# Altium footprint library pcb_ConnectorGeneral.PcbLib: 111 footprints (part 2 of 7)
Each footprint in its own frame and in the unit in brackets; x right, y up, seen from the top. Pads: shape width x height; smd on the part's side, far side on the other; paste and mask are expansions set on the pad; w line width, h text height; cw(c..) or ccw(c..) is an arc to the next point about the centre after c.
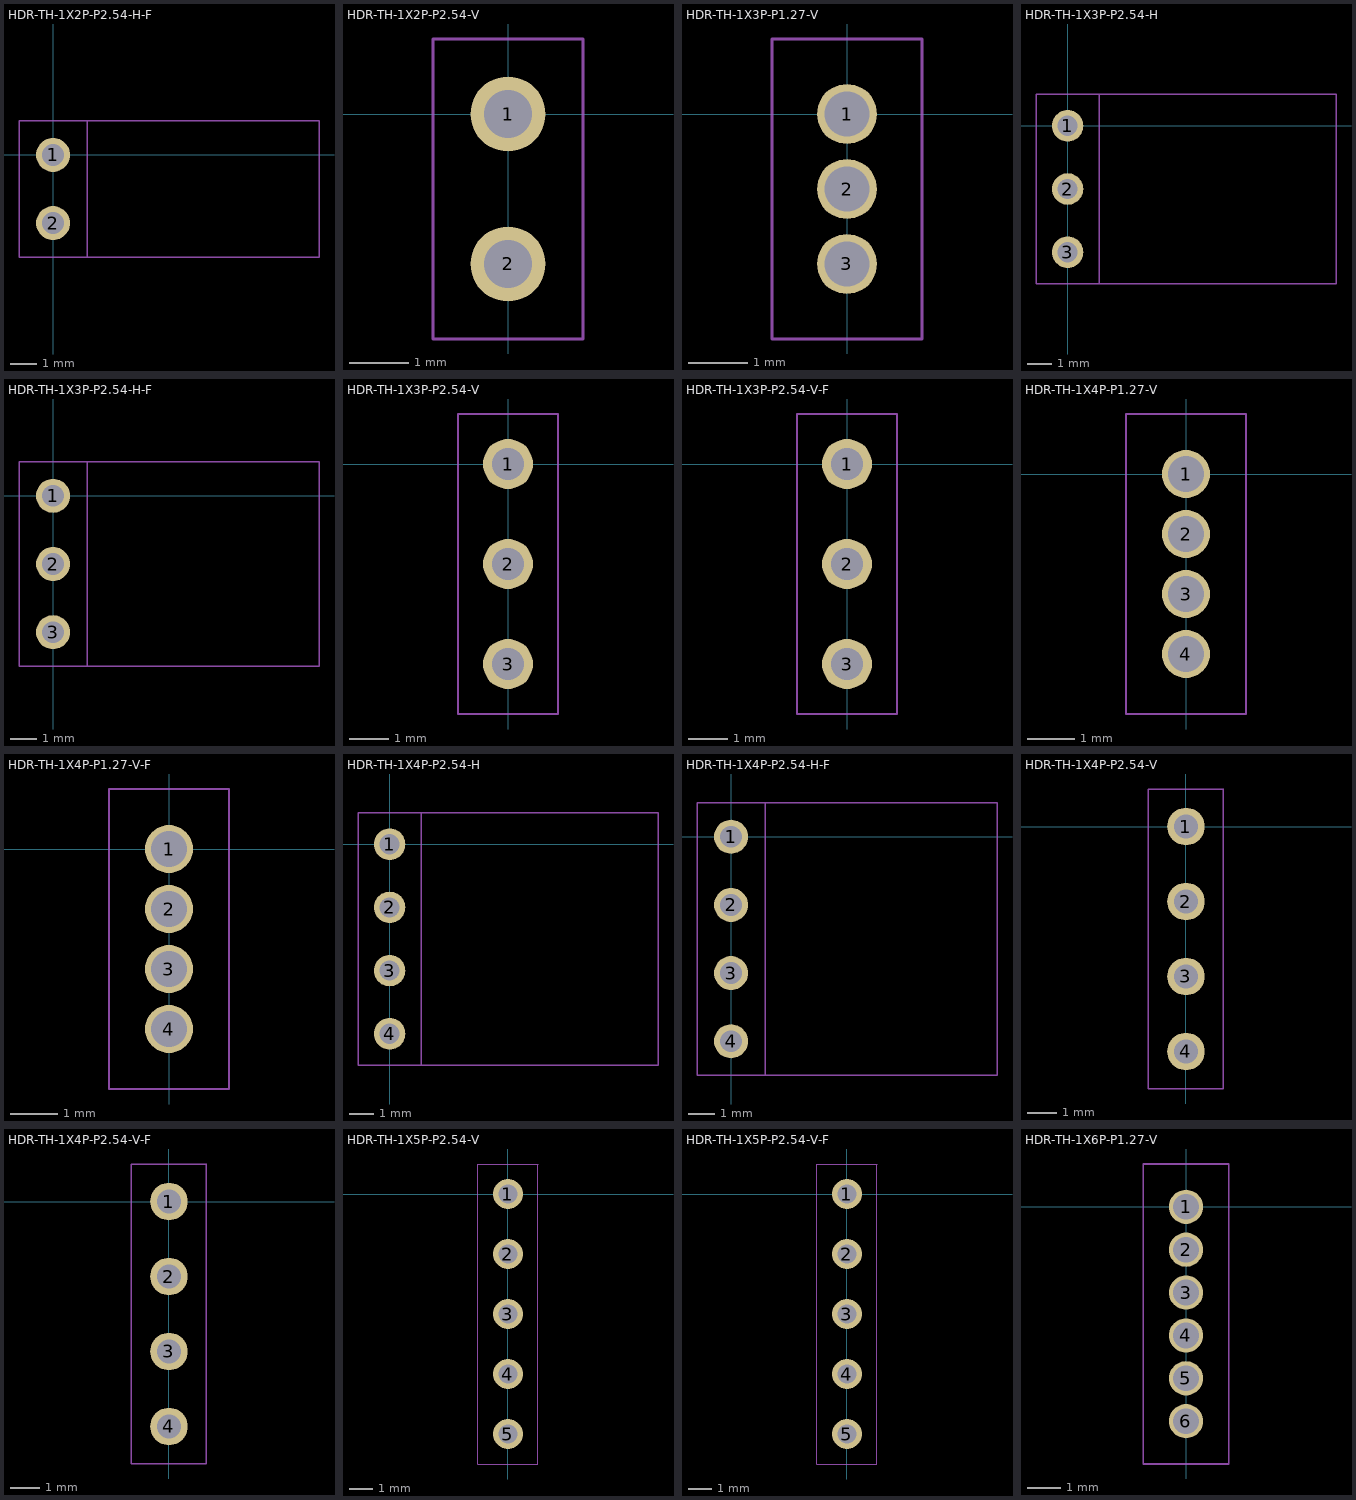
[diagram p1: the footprints below, top view; thin cyan lines are the x and y axes]

## HDR-TH-1X2P-P2.54-H-F [mil]
height 169.29
pads (2):
  round 50 hole 32: 1(0,0) 2(0,-100)
Mechanical 13:
  lines w2: -50,-150 390,-150 390,50 -50,50 -50,-150
Mechanical 14:
  lines w2: -50,-150 50,-150 50,50 -50,50 -50,-150
Mechanical 16:
  text ".Designator" at 0,0 h39.37
3D body "female_header_a-bl254-ea-g02d.stp": height 99.21, standoff -125.2, extent -10,-154.92 386.06,54.92

## HDR-TH-1X2P-P2.54-V [mil]
height 169.29
pads (2):
  round 50 hole 32: 1(0,0) 2(0,-100)
Mechanical 13:
  lines w2: -50,-150 -50,50 50,50 50,-150 -50,-150
Mechanical 14:
  lines w2: -50,-150 -50,50 50,50 50,-150 -50,-150
Mechanical 16:
  text ".Designator" at 0,0 h39.37
3D body "pin_header_aw140-eg-g02d.stp": height 322.83, standoff -118.11, extent -49.18,-150 49.18,50

## HDR-TH-1X3P-P1.27-V [mil]
height 169.29
pads (3):
  round 40 hole 30: 1(0,0) 2(0,-50) 3(0,-100)
Mechanical 13:
  lines w2: -50,-150 -50,50 50,50 50,-150 -50,-150
Mechanical 14:
  lines w2: -50,-150 -50,50 50,50 50,-150 -50,-150
Mechanical 16:
  text ".Designator" at 0,0 h39.37

## HDR-TH-1X3P-P2.54-H [mil]
height 169.29
pads (3):
  round 50 hole 32: 1(0,0) 2(0,-100) 3(0,-200)
Mechanical 13:
  lines w2: -50,-250 -50,50 425,50 425,-250 -50,-250
Mechanical 14:
  lines w2: -50,-250 50,-250 50,50 -50,50 -50,-250
Mechanical 16:
  text ".Designator" at 0,0 h39.37
3D body "pin_header_aw140-ea-g03g.stp": height 99.21, standoff -93.7, extent -15,-246.06 423.59,46.06

## HDR-TH-1X3P-P2.54-H-F [mil]
height 169.29
pads (3):
  round 50 hole 32: 1(0,0) 2(0,-100) 3(0,-200)
Mechanical 13:
  lines w2: -50,-250 390,-250 390,50 -50,50 -50,-250
Mechanical 14:
  lines w2: -50,-250 -50,50 50,50 50,-250 -50,-250
Mechanical 16:
  text ".Designator" at 0,0 h39.37
3D body "female_header_a-bl254-ea-g03d.stp": height 99.21, standoff -125.2, extent -10,-254.92 386.06,54.92

## HDR-TH-1X3P-P2.54-V [mil]
height 169.29
pads (3):
  round 50 hole 32: 1(0,0) 2(0,-100) 3(0,-200)
Mechanical 13:
  lines w2: -50,-250 50,-250 50,50 -50,50 -50,-250
Mechanical 14:
  lines w2: -50,-250 50,-250 50,50 -50,50 -50,-250
Mechanical 16:
  text ".Designator" at 0,0 h39.37
3D body "pin_header_aw140-eg-g03d.stp": height 322.83, standoff -118.11, extent -49.18,-250 49.18,50

## HDR-TH-1X3P-P2.54-V-F [mil]
height 169.29
pads (3):
  round 50 hole 32: 1(0,0) 2(0,-100) 3(0,-200)
Mechanical 13:
  lines w2: -50,-250 50,-250 50,50 -50,50 -50,-250
Mechanical 14:
  lines w2: -50,-250 50,-250 50,50 -50,50 -50,-250
Mechanical 16:
  text ".Designator" at 0,0 h39.37
3D body "female_header_a-bl254-eg-g03d.stp": height 334.65, standoff -125.98, extent -49.21,-254.92 49.22,54.92

## HDR-TH-1X4P-P1.27-V [mil]
height 169.29
pads (4):
  round 40 hole 30: 1(0,0) 2(0,-50) 3(0,-100) 4(0,-150)
Mechanical 13:
  lines w2: -50,-200 -50,50 50,50 50,-200 -50,-200
Mechanical 14:
  lines w2: -50,-200 -50,50 50,50 50,-200 -50,-200
Mechanical 16:
  text ".Designator" at 0,0 h39.37
3D body "pin_header_a-sl127-eg-g04d.stp": height 210.24, standoff -102.36, extent -49.21,-175 49.21,25

## HDR-TH-1X4P-P1.27-V-F [mil]
height 169.29
pads (4):
  round 40 hole 30: 1(0,0) 2(0,-50) 3(0,-100) 4(0,-150)
Mechanical 13:
  lines w2: -50,-200 -50,50 50,50 50,-200 -50,-200
Mechanical 14:
  lines w2: -50,-200 -50,50 50,50 50,-200 -50,-200
Mechanical 16:
  text ".Designator" at 0,0 h39.37
3D body "female_header_a-bl127-eg-g04d.stp": height 133.86, standoff -94.49, extent -35.86,-182.88 35,32.87

## HDR-TH-1X4P-P2.54-H [mil]
height 169.29
pads (4):
  round 50 hole 32: 1(0,0) 2(0,-100) 3(0,-200) 4(0,-300)
Mechanical 13:
  lines w2: -50,-350 -50,50 425,50 425,-350 -50,-350
Mechanical 14:
  lines w2: -50,-350 50,-350 50,50 -50,50 -50,-350
Mechanical 16:
  text ".Designator" at 0,0 h39.37
3D body "pin_header_aw140-ea-g04g.stp": height 99.21, standoff -93.7, extent -14.96,-346.06 423.63,46.07

## HDR-TH-1X4P-P2.54-H-F [mil]
height 169.29
pads (4):
  round 50 hole 32: 1(0,0) 2(0,-100) 3(0,-200) 4(0,-300)
Mechanical 13:
  lines w2: -50,-350 390,-350 390,50 -50,50 -50,-350
Mechanical 14:
  lines w2: -50,-350 -50,50 50,50 50,-350 -50,-350
Mechanical 16:
  text ".Designator" at 0,0 h39.37
3D body "female_header_a-bl254-ea-g04d.stp": height 99.21, standoff -125.2, extent -10,-354.92 386.06,54.92

## HDR-TH-1X4P-P2.54-V [mil]
height 169.29
pads (4):
  round 50 hole 32: 1(0,0) 2(0,-100) 3(0,-200) 4(0,-300)
Mechanical 13:
  lines w2: -50,-350 50,-350 50,50 -50,50 -50,-350
Mechanical 14:
  lines w2: -50,-350 50,-350 50,50 -50,50 -50,-350
Mechanical 16:
  text ".Designator" at 0,0 h39.37
3D body "pin_header_aw140-eg-g04d.stp": height 322.83, standoff -118.11, extent -49.19,-350 49.18,50

## HDR-TH-1X4P-P2.54-V-F [mil]
height 169.29
pads (4):
  round 50 hole 32: 1(0,0) 2(0,-100) 3(0,-200) 4(0,-300)
Mechanical 13:
  lines w2: -50,-350 50,-350 50,50 -50,50 -50,-350
Mechanical 14:
  lines w2: -50,-350 50,-350 50,50 -50,50 -50,-350
Mechanical 16:
  text ".Designator" at 0,0 h39.37
3D body "female_header_a-bl254-eg-g04d.stp": height 334.65, standoff -125.98, extent -49.22,-354.93 49.21,54.92

## HDR-TH-1X5P-P2.54-V [mil]
height 169.29
pads (5):
  round 50 hole 32: 1(0,0) 2(0,-100) 3(0,-200) 4(0,-300) 5(0,-400)
Mechanical 13:
  lines w2: -50,-450 -50,50 50,50 50,-450 -50,-450
Mechanical 14:
  lines w2: -50,-450 50,-450 50,50 -50,50 -50,-450
Mechanical 16:
  text ".Designator" at 0,0 h39.37
3D body "pin_header_aw140-eg-g05d.stp": height 322.83, standoff -118.11, extent -49.18,-450 49.18,50

## HDR-TH-1X5P-P2.54-V-F [mil]
height 169.29
pads (5):
  round 50 hole 32: 1(0,0) 2(0,-100) 3(0,-200) 4(0,-300) 5(0,-400)
Mechanical 13:
  lines w2: -50,-450 50,-450 50,50 -50,50 -50,-450
Mechanical 14:
  lines w2: -50,-450 -50,50 50,50 50,-450 -50,-450
Mechanical 16:
  text ".Designator" at 0,0 h39.37
3D body "female_header_a-bl254-eg-g05d.stp": height 334.65, standoff -125.98, extent -49.22,-454.93 49.21,54.91

## HDR-TH-1X6P-P1.27-V [mil]
height 169.29
pads (6):
  round 40 hole 30: 1(0,0) 2(0,-50) 3(0,-100) 4(0,-150) 5(0,-200) 6(0,-250)
Mechanical 13:
  lines w2: -50,-300 50,-300 50,50 -50,50 -50,-300
Mechanical 14:
  lines w2: -50,-300 50,-300 50,50 -50,50 -50,-300
Mechanical 16:
  text ".Designator" at 0,0 h39.37